# Altium integrated library Library.IntLib: 74 symbols
Pins are listed as number, name and electrical type; pins without a type are passive.

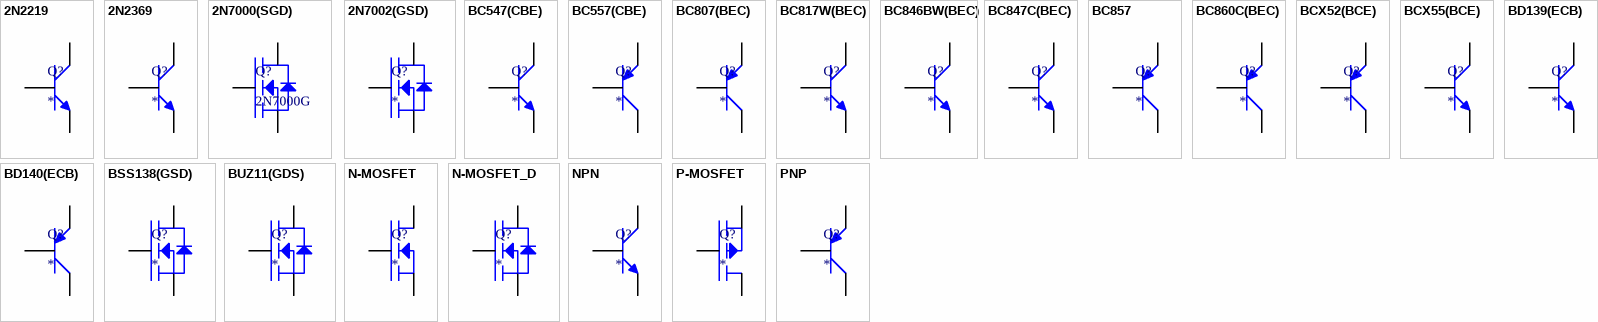
[diagram p0: symbols 2N2219 to PNP]

## 2N2219
designator Q?
NPN
footprint TO-39
pins: 1 C, 2 B, 3 E

## 2N2369
designator Q?
NPN
footprint TO–206AA
pins: 1 C, 2 B, 3 E

## 2N7000(SGD)
designator Q?, comment 2N7000G
N-MOSFET
footprint TO-92 (TO-92 BEND LEAD)
footprint TO-92-BL (TO-92 BEND LEAD)
pins: 1 S, 2 G, 3 D

## 2N7002(GSD)
designator Q?
N-MOSFET
footprint SOT23
pins: 1 G, 2 S, 3 D

## BC547(CBE)
designator Q?
NPN
footprint TO-92 (TO-92 BEND LEAD)
footprint TO-92-BL (TO-92 BEND LEAD)
pins: 1 C, 2 B, 3 E

## BC557(CBE)
designator Q?
PNP
footprint TO-92 (TO-92 BEND LEAD)
footprint TO-92-BL (TO-92 BEND LEAD)
pins: 1 C, 2 B, 3 E

## BC807(BEC)
designator Q?
PNP
footprint SOT23
pins: 1 B, 2 E, 3 C

## BC817W(BEC)
designator Q?
NPN
footprint SOT323
pins: 1 B, 2 E, 3 C

## BC846BW(BEC)
designator Q?
NPN
footprint SOT323
pins: 1 B, 2 E, 3 C

## BC847C(BEC)
designator Q?
NPN
footprint SOT23
pins: 1 B, 2 E, 3 C

## BC857
designator Q?
PNP
footprint SOT23
pins: 1 B, 2 E, 3 C

## BC860C(BEC)
designator Q?
PNP
footprint SOT23
pins: 1 B, 2 E, 3 C

## BCX52(BCE)
designator Q?
PNP
footprint SOT89
pins: 1 B, 2 C, 3 E

## BCX55(BCE)
designator Q?
NPN
footprint SOT89
pins: 1 B, 2 C, 3 E

## BD139(ECB)
designator Q?
NPN
footprint TO-126
pins: 1 E, 2 C, 3 B

## BD140(ECB)
designator Q?
PNP
footprint TO-126
pins: 1 E, 2 C, 3 B

## BSS138(GSD)
designator Q?
N-MOSFET
footprint SOT23
pins: 1 G, 2 S, 3 D

## BUZ11(GDS)
designator Q?
N-MOSFET
footprint TO-220
pins: 1 G, 2 D, 3 S

## N-MOSFET
designator Q?
pins: 1 D, 2 G, 3 S

## N-MOSFET_D
designator Q?
pins: 1 D, 2 G, 3 S

## NPN
designator Q?
pins: 1 C, 2 B, 3 E

## P-MOSFET
designator Q?
pins: 1 S, 2 G, 3 G

## PNP
designator Q?
pins: 1 E, 2 B, 3 C


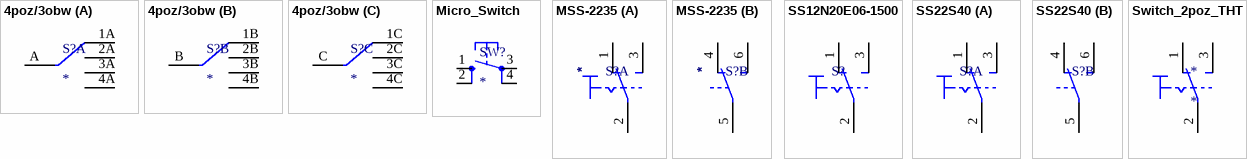
[diagram p1: symbols 4poz/3obw to Switch_2poz_THT]

## 4poz/3obw
designator S?
footprint 4poz/3obw
part A pins: 1A, 2A, 3A, 4A, A
part B pins: 1B, 2B, 3B, 4B, B
part C pins: 1C, 2C, 3C, 4C, C

## Micro_Switch
designator SW?
footprint tactwitch
footprint tactwitch _SMD
pins: 1 S, 2 S1, 3 P, 4 P1

## MSS-2235
designator S?
footprint MSS-2235
part A pins: 1, 2, 3
part B pins: 4, 5, 6

## SS12N20E06-1500
designator S?  (value not drawn)
SPDT THT
footprint SS12N20E06-1500
pins: 1, 2, 3

## SS22S40
designator S?  (value not drawn)
DPDT SMD
footprint SS22S40
part A pins: 1, 2, 3
part B pins: 4, 5, 6

## Switch_2poz_THT
designator *
footprint Switch_2poz_V
pins: 1, 2, 3


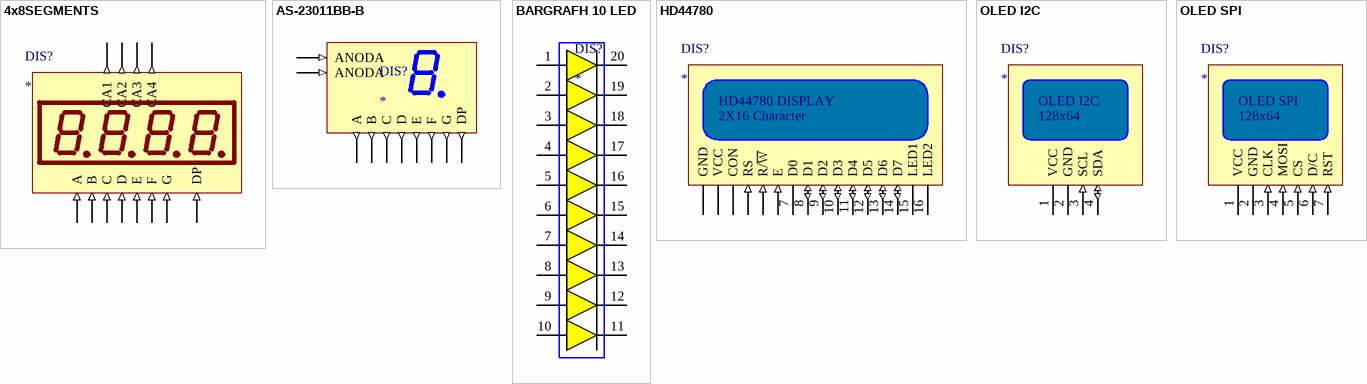
[diagram p2: symbols 4x8SEGMENTS to OLED SPI]

## 4x8SEGMENTS
designator DIS?
footprint FJ5461BH
pins: 1 E (in), 2 D (in), 3 DP (in), 4 C (in), 5 G (in), 6 CA4 (out), 7 B (in), 8 CA3 (out), 9 CA2 (out), 10 F (in), 11 A (in), 12 CA1 (out)

## AS-23011BB-B
designator DIS?
footprint AS-23011BB-B
pins: 1 ANODA (in), 2 E (out), 3 D (out), 4 C (out), 5 ANODA (in), 6 B (out), 7 A (out), 8 DP (out), 9 F (out), 10 G (out)

## BARGRAFH 10 LED
designator DIS?
footprint BARGRAFH_10LED
pins: 1 (power), 2 (power), 3 (power), 4 (power), 5 (power), 6 (power), 7 (power), 8 (power), 9 (power), 10 (power), 11 (power), 12 (power), 13 (power), 14 (power), 15 (power), 16 (power), 17 (power), 18 (power), 19 (power), 20 (power)

## HD44780
designator DIS?
footprint HD44780
pins: 1 GND (power), 2 VCC (power), 3 CON, 4 RS (in), 5 R/~{W} (in), 6 E (in), 7 D0, 8 D1 (io), 9 D2 (io), 10 D3 (io), 11 D4 (io), 12 D5 (io), 13 D6 (io), 14 D7 (io), 15 LED1, 16 LED2
text: HD44780 DISPLAY; 2X16 Character

## OLED I2C
designator DIS?
footprint OLED I2C
pins: 1 VCC (power), 2 GND (power), 3 SCL (in), 4 SDA (io)
text: 128x64

## OLED SPI
designator DIS?
footprint OLED SPI
pins: 1 VCC (power), 2 GND (power), 3 CLK (in), 4 MOSI (in), 5 CS (in), 6 D/C (in), 7 RST (in)
text: 128x64

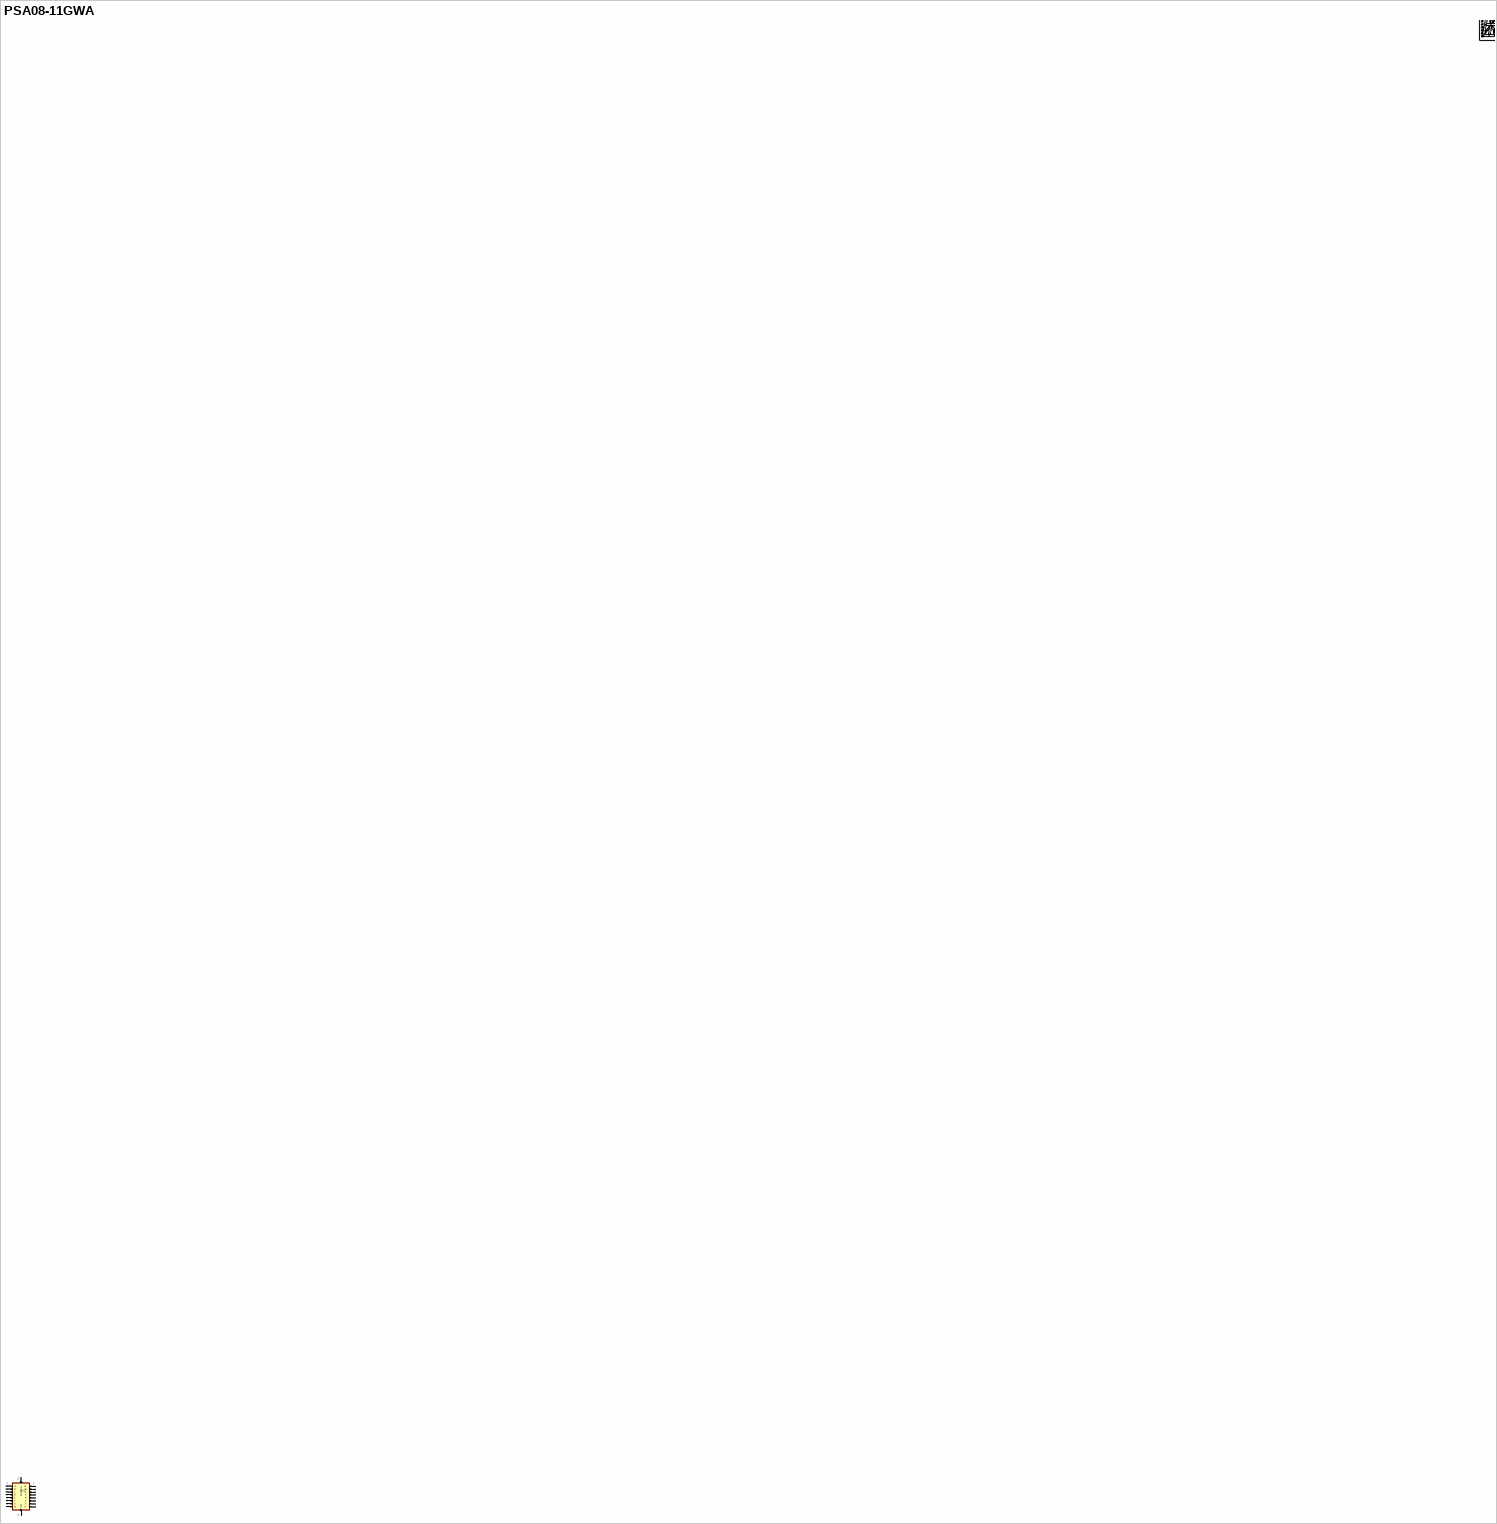
[diagram p3: symbol PSA08-11GWA]

## PSA08-11GWA
designator DIS?
footprint PSA08-11GWA
pins: 1 A (out), 2 M (out), 3 K (out), 4 H (out), 5 U (out), 6 S (out), 7 T (out), 8 G (out), 9 F (out), 10 E (out), 11 ANODA (in), 12 DP (out), 13 D (out), 14 R (out), 15 P (out), 16 C (out), 17 N (out), 18 B (out)

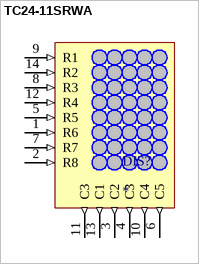
[diagram p4: symbol TC24-11SRWA]

## TC24-11SRWA
designator DIS?
footprint TC24-11SRWA
pins: 1 R6 (in), 2 R8 (in), 3 C2 (out), 4 C3 (out), 5 R5 (in), 6 C5 (out), 7 R7 (in), 8 R3 (in), 9 R1 (in), 10 C4 (out), 11 C3 (out), 12 R4 (in), 13 C1 (out), 14 R2 (in)


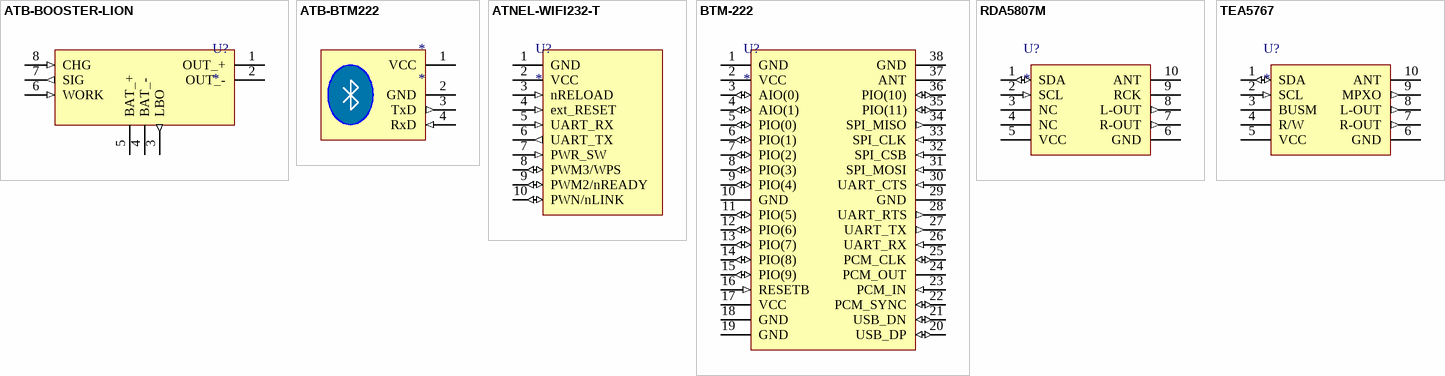
[diagram p5: symbols ATB-BOOSTER-LION to TEA5767]

## ATB-BOOSTER-LION
designator U?
footprint ATB-BOOSTER_LION_V02
pins: 1 OUT_+ (power), 2 OUT_- (power), 3 LBO (out), 4 BAT_- (power), 5 BAT_+ (power), 6 WORK (in), 7 SIG (out), 8 CHG (in)

## ATB-BTM222
designator *
footprint ATB-BTM222-MODULE
pins: 1 VCC (power), 2 GND (power), 3 TxD (out), 4 RxD (in)

## ATNEL-WIFI232-T
designator U?
footprint ATNEL-WIFI232-T
pins: 1 GND (power), 2 VCC (power), 3 nRELOAD (in), 4 ext_RESET (in), 5 UART_RX (in), 6 UART_TX (out), 7 PWR_SW (in), 8 PWM3/WPS (io), 9 PWM2/nREADY (io), 10 PWN/nLINK (io)

## BTM-222
designator U?
footprint BTM-222
pins: 1 GND (power), 2 VCC (power), 3 AIO(0) (io), 4 AIO(1) (io), 5 PIO(0) (io), 6 PIO(1) (io), 7 PIO(2) (io), 8 PIO(3) (io), 9 PIO(4) (io), 10 GND (power), 11 PIO(5) (io), 12 PIO(6) (io), 13 PIO(7) (io), 14 PIO(8) (io), 15 PIO(9) (io), 16 RESETB (in), 17 VCC (power), 18 GND (power), 19 GND (power), 20 USB_DP (io), 21 USB_DN (io), 22 PCM_SYNC (io), 23 PCM_IN (in), 24 PCM_OUT, 25 PCM_CLK (io), 26 UART_RX (in), 27 UART_TX (out), 28 UART_RTS (out), 29 GND (power), 30 UART_CTS (in), 31 SPI_MOSI (in), 32 SPI_CSB (in), 33 SPI_CLK (in), 34 SPI_MISO (out), 35 PIO(11) (io), 36 PIO(10) (io), 37 ANT, 38 GND (power)

## RDA5807M
designator U?
footprint RDA5807M
pins: 1 SDA (io), 2 SCL (in), 3 NC, 4 NC, 5 VCC (power), 6 GND (power), 7 R-OUT (out), 8 L-OUT (out), 9 RCK, 10 ANT

## TEA5767
designator U?
footprint TEA5767
pins: 1 SDA (io), 2 SCL (in), 3 BUSM, 4 R/W, 5 VCC (power), 6 GND (power), 7 R-OUT (out), 8 L-OUT (out), 9 MPXO (out), 10 ANT


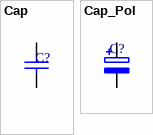
[diagram p6: symbols Cap to Cap_Pol]

## Cap
designator C?
Capacitor
footprint C0603 (Chip Capacitor, Body 1.6x0.8mm, Height 1.0mm, IPC Low Density)
footprint C0805 (Chip Capacitor, Body 2.0x1.2mm, Height 1.3mm, IPC Low Density)
footprint C1206 (Chip Capacitor, Body 3.2x1.6mm, Height 1.5mm, IPC Low Density)
footprint MKT 5mm
footprint CERAM 2.54mm
footprint 330nF/400V MKT
pins: 1, 2
1 alternate drawing of the same symbol

## Cap_Pol
designator C?
Capacitor Polarized
footprint TANC_A
footprint TANC_B
footprint TANC_C
footprint TANC_D
footprint 100uF/25V_2.5/6.3/11mm
footprint SMD_6.3x5.4mm
footprint 10uf/400V_5/10/20
pins: 1, 2


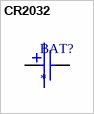
[diagram p7: symbol CR2032]

## CR2032
designator BAT?
CR2032 Holder
footprint CR2032_H
footprint CR2032_holder_H
footprint CR2032_holder_V
footprint CR2032_V
pins: 1 + (power), 2 - (power)


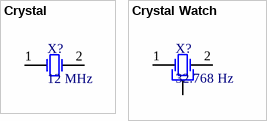
[diagram p8: symbols Crystal to Crystal Watch]

## Crystal
designator X?, comment 12 MHz
footprint HC49 (THT)
footprint HC49SM (SMD)
footprint XT324
pins: 1 OSC1, 2 OSC2

## Crystal Watch
designator X?, comment 32.768 Hz
footprint TC26
footprint TC26_V
pins: 1, 2, 3


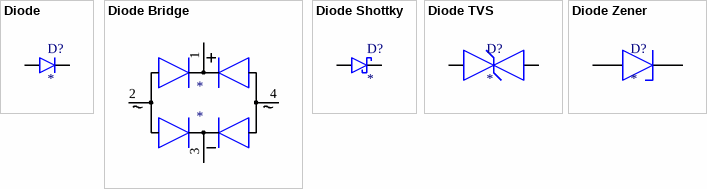
[diagram p9: symbols Diode to Diode Zener]

## Diode
designator D?
footprint SMA
footprint SMB
footprint SMC
footprint SOD80C
footprint SOD123
footprint SOD323
footprint DO35-10
footprint DO41-10
footprint D1206 (Chip Resistor, Body 3.2x1.6mm, IPC Low Density)
footprint D0805 (Chip Resistor, Body 2.0x1.3mm, IPC Low Density)
footprint DO-213A
footprint DO-213AB
pins: 1 (power), 2 (power)

## Diode Bridge
designator *
pins: 1, 2, 3, 4

## Diode Shottky
designator D?
footprint SMA
footprint SMB
footprint SMC
footprint SOD80C
footprint SOD123
footprint SOD323
footprint DO35-10
footprint DO41-10
footprint DO-213AB
pins: 1 (power), 2 (power)

## Diode TVS
designator D?
footprint SMA
footprint SMB
footprint SMC
footprint SOD80C
footprint SOD123
footprint SOD323
footprint DO35-10
footprint DO41-10
pins: 1 (power), 2 (power)

## Diode Zener
designator D?
footprint SMA
footprint SMB
footprint SMC
footprint SOD80C
footprint SOD123
footprint SOD323
footprint DO35-10
footprint DO41-10
pins: 1 (power), 2 (power)


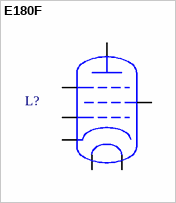
[diagram p10: symbol E180F]

## E180F
designator L?  (value not drawn)
footprint E180F
pins: a, f1, f2, g1, g2, g3, k


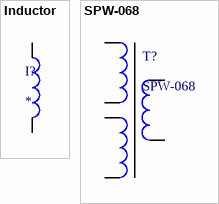
[diagram p11: symbols Inductor to SPW-068]

## Inductor
designator I?
footprint INDUCTOR
footprint DO3316P
pins: 1, 2

## SPW-068
designator T?
footprint SPW-068
pins: 1, 2, 3, 4, 5, 6


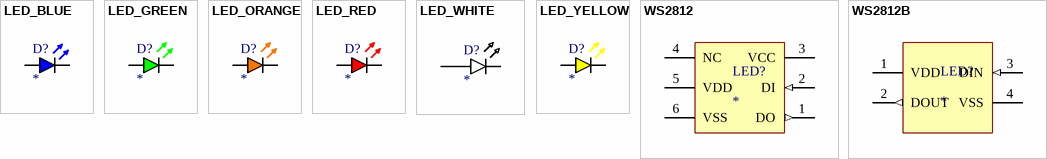
[diagram p12: symbols LED_BLUE to WS2812B]

## LED_BLUE
designator D?
LED
footprint LED0603 (Chip Diode Led, Body 1.6x0.8mm, IPC Low Density)
footprint LED0805 (Chip Diode Led, Body 2.0x1.3mm, IPC Low Density)
footprint LED1206 (Chip Diode Led, Body 3.2x1.6mm, IPC Low Density)
footprint LED3MM
footprint LED5MM
pins: 1, 2

## LED_GREEN
designator D?
LED
footprint LED0603 (Chip Diode Led, Body 1.6x0.8mm, IPC Low Density)
footprint LED0805 (Chip Diode Led, Body 2.0x1.3mm, IPC Low Density)
footprint LED1206 (Chip Diode Led, Body 3.2x1.6mm, IPC Low Density)
footprint LED3MM
footprint LED5MM
pins: 1, 2

## LED_ORANGE
designator D?
LED
footprint LED0603 (Chip Diode Led, Body 1.6x0.8mm, IPC Low Density)
footprint LED0805 (Chip Diode Led, Body 2.0x1.3mm, IPC Low Density)
footprint LED1206 (Chip Diode Led, Body 3.2x1.6mm, IPC Low Density)
footprint LED3MM
footprint LED5MM
pins: 1, 2

## LED_RED
designator D?
LED
footprint LED0603 (Chip Diode Led, Body 1.6x0.8mm, IPC Low Density)
footprint LED0805 (Chip Diode Led, Body 2.0x1.3mm, IPC Low Density)
footprint LED1206 (Chip Diode Led, Body 3.2x1.6mm, IPC Low Density)
footprint LED3MM
footprint LED5MM
pins: 1, 2

## LED_WHITE
designator D?
LED
footprint LED0603 (Chip Diode Led, Body 1.6x0.8mm, IPC Low Density)
footprint LED0805 (Chip Diode Led, Body 2.0x1.3mm, IPC Low Density)
footprint LED1206 (Chip Diode Led, Body 3.2x1.6mm, IPC Low Density)
footprint LED3MM
footprint LED5MM
pins: 1, 2

## LED_YELLOW
designator D?
LED
footprint LED0603 (Chip Diode Led, Body 1.6x0.8mm, IPC Low Density)
footprint LED0805 (Chip Diode Led, Body 2.0x1.3mm, IPC Low Density)
footprint LED1206 (Chip Diode Led, Body 3.2x1.6mm, IPC Low Density)
footprint LED3MM
footprint LED5MM
pins: 1, 2

## WS2812
designator LED?
footprint WS2812
pins: 1 DO (out), 2 DI (in), 3 VCC (power), 4 NC, 5 VDD (power), 6 VSS (power)

## WS2812B
designator LED?
footprint WS2812b
pins: 1 VDD (power), 2 DOUT (out), 3 DIN (in), 4 VSS (power)


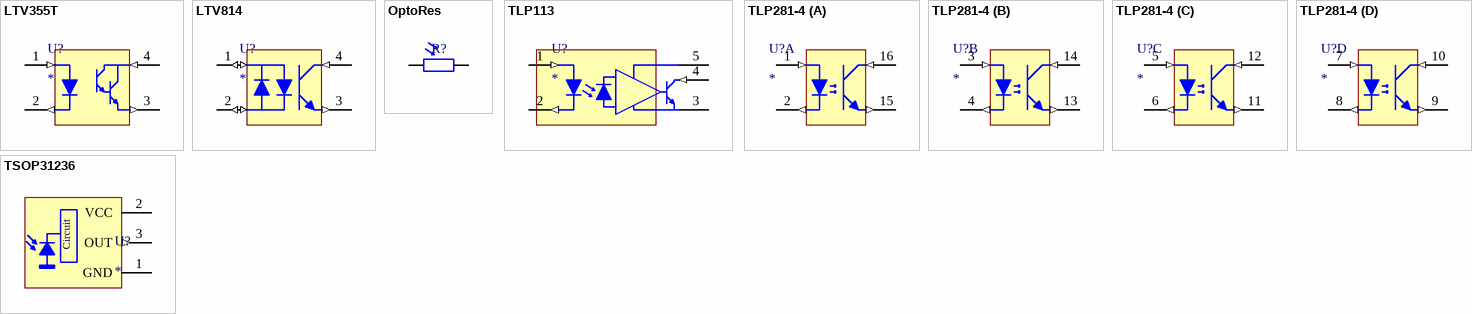
[diagram p13: symbols LTV355T to TSOP31236]

## LTV355T
designator U?
footprint LTV355T
pins: 1 (in), 2 (out), 3 (out), 4 (in)

## LTV814
designator U?
footprint LTV814
pins: 1 (io), 2 (io), 3 (out), 4 (in)

## OptoRes
designator R?
Resistor
footprint OptoRes
pins: 1, 2

## TLP113
designator U?
footprint TLP113
pins: 1 (in), 2 (out), 3 (power), 4 (in), 5 (power)

## TLP281-4
designator U?
footprint TLP281-4
part A pins: 1 (in), 2 (out), 15 3 (out), 16 4 (in)
part B pins: 3 1 (in), 4 2 (out), 13 3 (out), 14 4 (in)
part C pins: 5 1 (in), 6 2 (out), 11 3 (out), 12 4 (in)
part D pins: 7 1 (in), 8 2 (out), 9 3 (out), 10 4 (in)

## TSOP31236
designator U?
footprint TSOP31236
pins: 1 GND (power), 2 VCC (power), 3 OUT (out)
text: Circuit


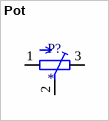
[diagram p14: symbol Pot]

## Pot
designator P?
footprint POT_B25P
footprint POT_CA6H
footprint POT_CA6V
footprint POT_CA9H
footprint POT_CA9V
footprint POT_CA14H
footprint POT_CA14V
footprint POT_CT6
footprint POT_PT-10
footprint POT_PT-10S
footprint POT_PT-SPIN
footprint POT_SMD_3x3.5x1.55
footprint POT-TVP1212
pins: 1 A, 2 S, 3 E


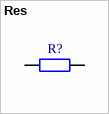
[diagram p15: symbol Res]

## Res
designator R?
Resistor
footprint R0402 (Chip Resistor, Body 1.0x0.5mm, IPC Low Density)
footprint R0805 (Chip Resistor, Body 2.0x1.3mm, IPC Low Density)
footprint R0603 (Chip Resistor, Body 1.6x0.8mm, IPC Low Density)
footprint R1206 (Chip Resistor, Body 3.2x1.6mm, IPC Low Density)
footprint RCL_0207/10
footprint R_2W/15
footprint R_2W/25_RWC
footprint R_1W/12.7
pins: 1, 2


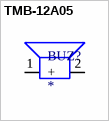
[diagram p16: symbol TMB-12A05]

## TMB-12A05
designator BUZ?
footprint TMB-12A05
pins: 1 +, 2


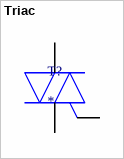
[diagram p17: symbol Triac]

## Triac
designator T?
footprint TO-220
pins: 1, 2, 3